# Altium footprint library Selex_PCBLib.PcbLib: 388 footprints (part 15 of 25)
Each footprint in its own frame and in the unit in brackets; x right, y up, seen from the top. Pads: shape width x height; smd on the part's side, far side on the other; paste and mask are expansions set on the pad; w line width, h text height; cw(c..) or ccw(c..) is an arc to the next point about the centre after c.
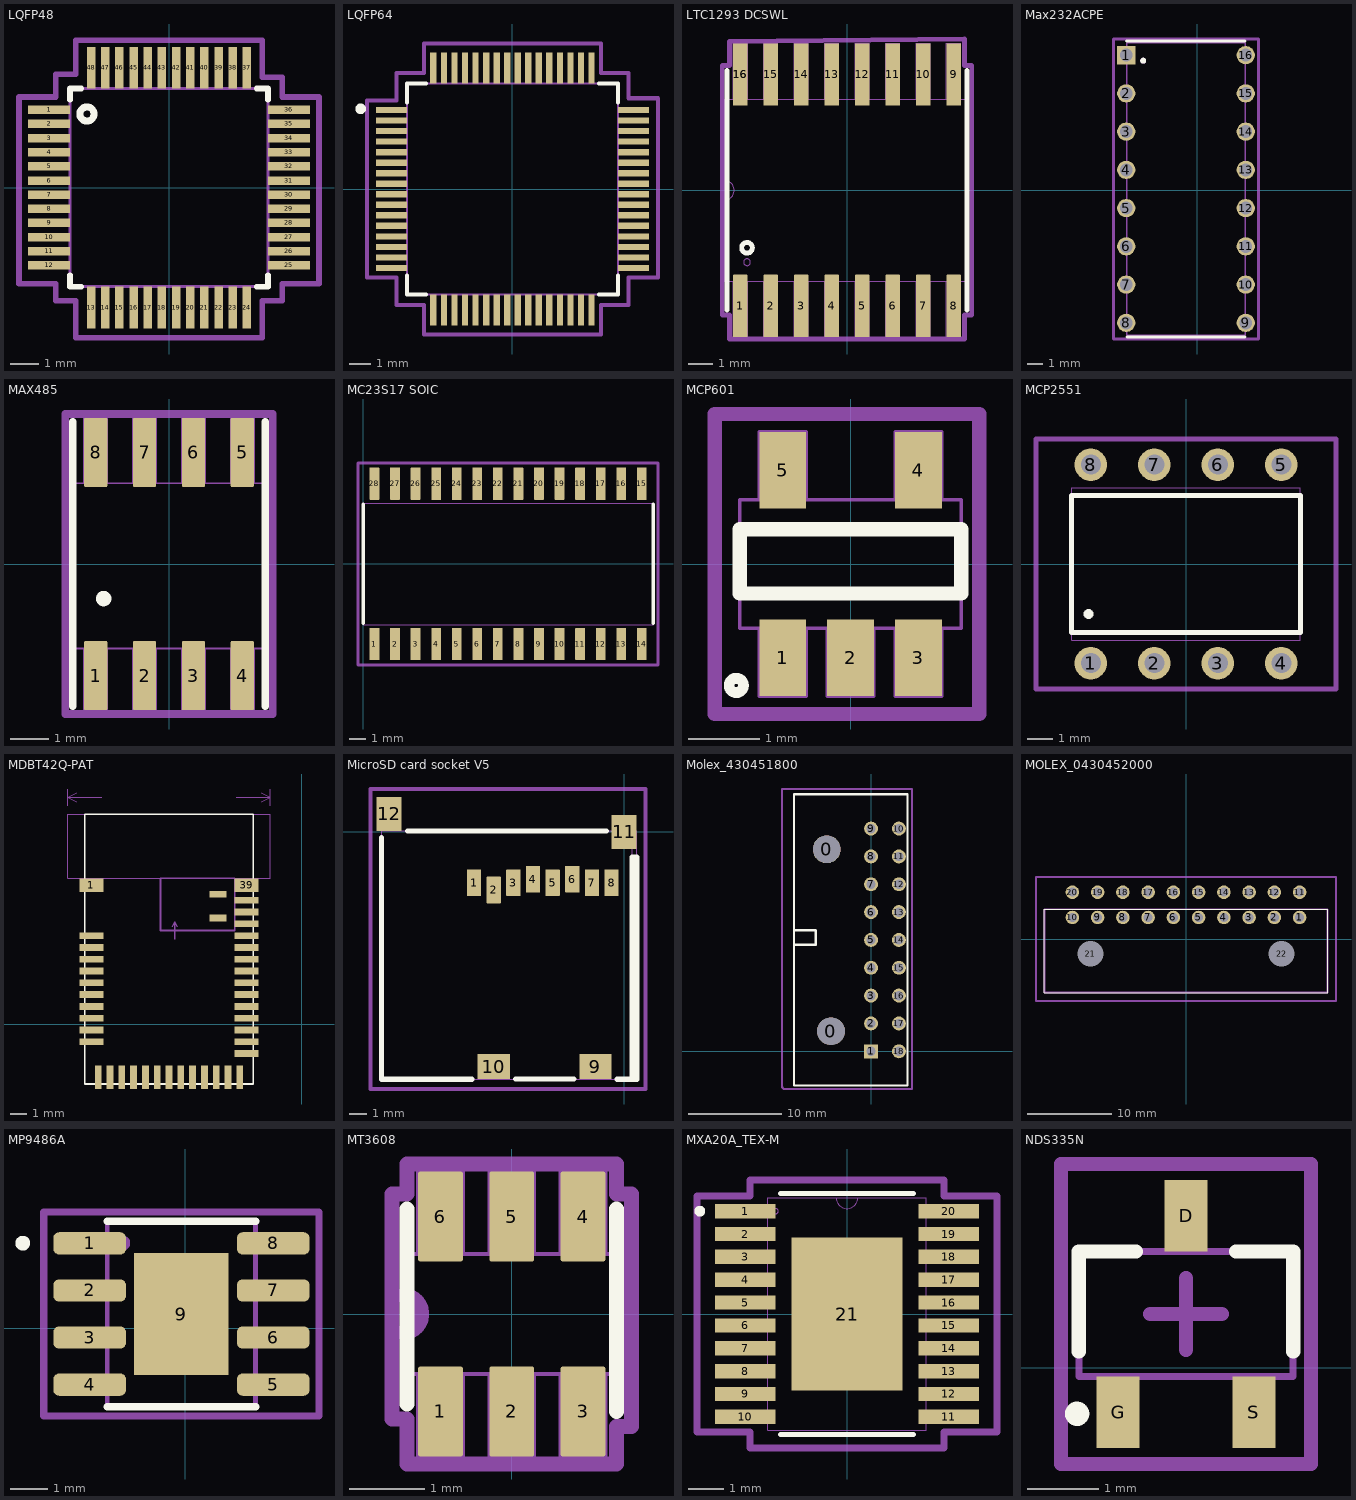
[diagram p14: the footprints below, top view; thin cyan lines are the x and y axes]

## LQFP48 [mm] "LQFP48_0P5x8P5"
pads (48):
  rect 1.475x0.3 smd: 1(-4.238,2.75) 2(-4.238,2.25) 3(-4.238,1.75) 4(-4.238,1.25) 5(-4.238,0.75) 6(-4.238,0.25) 7(-4.238,-0.25) 8(-4.238,-0.75) 9(-4.238,-1.25) 10(-4.238,-1.75) 11(-4.238,-2.25) 12(-4.238,-2.75) 25(4.238,-2.75) 26(4.238,-2.25) 27(4.238,-1.75) 28(4.238,-1.25) 29(4.238,-0.75) 30(4.238,-0.25) 31(4.238,0.25) 32(4.238,0.75) 33(4.238,1.25) 34(4.238,1.75) 35(4.238,2.25) 36(4.238,2.75)
  rect 0.3x1.475 smd: 13(-2.75,-4.238) 14(-2.25,-4.238) 15(-1.75,-4.238) 16(-1.25,-4.238) 17(-0.75,-4.238) 18(-0.25,-4.238) 19(0.25,-4.238) 20(0.75,-4.238) 21(1.25,-4.238) 22(1.75,-4.238) 23(2.25,-4.238) 24(2.75,-4.238) 37(2.75,4.238) 38(2.25,4.238) 39(1.75,4.238) 40(1.25,4.238) 41(0.75,4.238) 42(0.25,4.238) 43(-0.25,4.238) 44(-0.75,4.238) 45(-1.25,4.238) 46(-1.75,4.238) 47(-2.25,4.238) 48(-2.75,4.238)
Top Overlay:
  circle w0.25: c-2.9,2.6 r0.25
  lines w0.2: -3.5,-3.1 -3.5,-3.5 -3.1,-3.5 ; -3.5,3.1 -3.5,3.5 -3.1,3.5 ; 3.1,-3.5 3.5,-3.5 3.5,-3.1 ; 3.1,3.5 3.5,3.5 3.5,3.1
Mechanical 13:
  lines w0.1: -3.5,-3.5 3.5,-3.5 3.5,3.5 -3.5,3.5 -3.5,-3.5
Mechanical 15:
  lines w0.2: -5.3,-3.4 -4,-3.4 -4,-4 -3.3,-4 -3.3,-5.3 3.3,-5.3 3.3,-4 4,-4 4,-3.4 5.3,-3.4 5.3,3.2 4,3.2 4,3.9 3.3,3.9 3.3,5.2 -3.3,5.2 -3.3,4 -4,4 -4,3.2 -5.3,3.2 -5.3,-3.4
3D body "STM32G431C6T6.stp": height 0, standoff 0, extent 0,0 0,0

## LQFP64 [mm] "LQFP64_0P5x11P5"
pads (64):
  rect 1.475x0.3 smd: 1(-5.738,3.75) 2(-5.738,3.25) 3(-5.738,2.75) 4(-5.738,2.25) 5(-5.738,1.75) 6(-5.738,1.25) 7(-5.738,0.75) 8(-5.738,0.25) 9(-5.738,-0.25) 10(-5.738,-0.75) 11(-5.738,-1.25) 12(-5.738,-1.75) 13(-5.738,-2.25) 14(-5.738,-2.75) 15(-5.738,-3.25) 16(-5.738,-3.75) 33(5.738,-3.75) 34(5.738,-3.25) 35(5.738,-2.75) 36(5.738,-2.25) 37(5.738,-1.75) 38(5.738,-1.25) 39(5.738,-0.75) 40(5.738,-0.25) 41(5.738,0.25) 42(5.738,0.75) 43(5.738,1.25) 44(5.738,1.75) 45(5.738,2.25) 46(5.738,2.75) 47(5.738,3.25) 48(5.738,3.75)
  rect 0.3x1.475 smd: 17(-3.75,-5.738) 18(-3.25,-5.738) 19(-2.75,-5.738) 20(-2.25,-5.738) 21(-1.75,-5.738) 22(-1.25,-5.738) 23(-0.75,-5.738) 24(-0.25,-5.738) 25(0.25,-5.738) 26(0.75,-5.738) 27(1.25,-5.738) 28(1.75,-5.738) 29(2.25,-5.738) 30(2.75,-5.738) 31(3.25,-5.738) 32(3.75,-5.738) 49(3.75,5.738) 50(3.25,5.738) 51(2.75,5.738) 52(2.25,5.738) 53(1.75,5.738) 54(1.25,5.738) 55(0.75,5.738) 56(0.25,5.738) 57(-0.25,5.738) 58(-0.75,5.738) 59(-1.25,5.738) 60(-1.75,5.738) 61(-2.25,5.738) 62(-2.75,5.738) 63(-3.25,5.738) 64(-3.75,5.738)
Top Overlay:
  circle w0.25: c-7.2,3.8 r0.125
  lines w0.2: -5,-4.1 -5,-5 -4.1,-5 ; -5,4.1 -5,5 -4.1,5 ; 4.1,-5 5,-5 5,-4.1 ; 4.1,5 5,5 5,4.1
Mechanical 13:
  lines w0.1: -5,-5 -5,5 5,5 5,-5 -5,-5
Mechanical 15:
  lines w0.2: -6.9,-4.2 -6.9,4.2 -5.5,4.2 -5.5,5.5 -4.2,5.5 -4.2,6.9 4.2,6.9 4.2,5.5 5.5,5.5 5.5,4.3 6.9,4.3 6.9,-4.2 5.5,-4.2 5.5,-5.5 4.2,-5.5 4.2,-6.9 -4.2,-6.9 -4.2,-5.5 -5.5,-5.5 -5.5,-4.2 -6.9,-4.2
3D body "STM32F103RBT6.stp": height 1.6, standoff 0, extent -6,-6 6,6

## LTC1293 DCSWL [mm] "SMD, 16-Lead plastic SOL"
height 2.7
pads (17):
  rrect10% 0.6x2.6 smd mask+0.05: 1(-4.445,-4.821) 2(-3.175,-4.821) 3(-1.905,-4.821) 4(-0.635,-4.821) 5(0.635,-4.821) 6(1.905,-4.821) 7(3.175,-4.821) 8(4.445,-4.821) 9(4.445,4.822) 10(3.175,4.822) 11(1.905,4.822) 12(0.635,4.822) 13(-0.635,4.822) 14(-1.905,4.822) 15(-3.175,4.822) 16(-4.445,4.822) 16(-4.445,4.822)
Top Overlay:
  circle w0.2: c-4.165,-2.4 r0.224
  lines w0.2: -5,-5 -5,5 ; 5,-5 5,5
Mechanical 1:
  circle w0.05: c-4.165,-3 r0.141
  lines w0.05: -5.1,-0.405 ccw(c-5.1,-0.003) -5.1,0.4 ; -4.745,-3.798 -4.745,-6.121 -4.145,-6.121 -4.145,-3.798 -4.334,-3.798 -5.1,-3.798 -5.1,3.798 -4.556,3.798 -4.145,3.798 -4.145,6.122 -4.745,6.122 -4.745,3.798 ; -4.61,-3.798 5,-3.798 ; -4.61,3.798 5,3.798 ; 5.045,-3.798 5.045,-1.899 5.045,1.899 5.045,3.798 ; -3.475,-6.121 -3.475,-3.798 -3.064,-3.798 -2.875,-3.798 -2.875,-6.121 -3.475,-6.121 ; -3.475,3.798 -3.475,6.122 -2.875,6.122 -2.875,3.798 -3.286,3.798 -3.475,3.798 ; -2.205,-6.121 -1.605,-6.121 -1.605,-3.798 -1.794,-3.798 -2.205,-3.798 -2.205,-6.121 ; -2.205,3.798 -2.205,6.122 -1.605,6.122 -1.605,3.798 -2.016,3.798 -2.205,3.798 ; -0.935,-6.121 -0.335,-6.121 -0.335,-3.798 -0.524,-3.798 -0.935,-3.798 -0.935,-6.121 ; -0.935,3.798 -0.935,6.122 -0.335,6.122 -0.335,3.798 -0.746,3.798 -0.935,3.798 ; 0.335,-6.121 0.935,-6.121 0.935,-3.798 0.746,-3.798 0.335,-3.798 0.335,-6.121 ; 0.335,3.798 0.335,6.122 0.935,6.122 0.935,3.798 0.524,3.798 0.335,3.798 ; 1.605,-6.121 2.205,-6.121 2.205,-3.798 2.016,-3.798 1.605,-3.798 1.605,-6.121 ; 1.605,3.798 1.605,6.122 2.205,6.122 2.205,3.798 1.794,3.798 1.605,3.798 ; 2.875,-6.121 3.475,-6.121 3.475,-3.798 3.286,-3.798 2.875,-3.798 2.875,-6.121 ; 2.875,3.798 2.875,6.122 3.475,6.122 3.475,3.798 3.064,3.798 2.875,3.798 ; 4.145,-6.121 4.745,-6.121 4.745,-3.798 4.556,-3.798 4.145,-3.798 4.145,-6.121 ; 4.145,3.798 4.145,6.122 4.745,6.122 4.745,3.798 4.334,3.798 4.145,3.798
Mechanical 15:
  lines w0.2: -5.2,-0.1 -5.2,5.2 -4.9,5.2 -4.9,6.2 4.9,6.3 4.9,5.2 5.2,5.2 5.2,-5.2 4.9,-5.2 4.9,-6.2 -4.9,-6.2 -4.9,-5.2 -5.2,-5.2 -5.2,0.4
3D body "CircuitWorks-SOL-16.step": height 1.75, standoff 0, extent -5.165,-4.55 4.835,4.75

## Max232ACPE [mm]
pads (16):
  rect 1.21x1.21 hole 0.86: 1(-4.728,8.969)
  round 1.21 hole 0.86: 2(-4.728,6.429) 3(-4.728,3.889) 4(-4.728,1.349) 5(-4.728,-1.191) 6(-4.728,-3.731) 7(-4.728,-6.271) 8(-4.728,-8.811) 9(3.212,-8.811) 10(3.212,-6.271) 11(3.212,-3.731) 12(3.212,-1.191) 13(3.212,1.349) 14(3.212,3.889) 15(3.212,6.429) 16(3.212,8.969)
Top Overlay:
  circle w0.2: c-3.6,8.6 r0.1
  lines w0.2: -4.7,9.9 3.17,9.9 ; -4.693,-9.738 3.177,-9.738
Mechanical 13:
  circle w0.2: c-3.6,8.6 r0.1
  lines w0.127: -4.693,-9.636 3.177,-9.636 3.177,9.794 -4.693,9.794 -4.693,-9.636
Mechanical 15:
  lines w0.2: -5.583,-9.886 4.067,-9.886 4.067,10.044 -5.583,10.044 -5.583,-9.886

## MAX485 [mm] "SMD, SOP8, 8PIN, 0.65"
height 1.1
pads (8):
  rrect10% 0.6x1.8 smd mask+0.05: 1(-1.905,-2.9) 2(-0.635,-2.9) 3(0.635,-2.9) 4(1.905,-2.9) 5(1.905,2.9) 6(0.635,2.9) 7(-0.635,2.9) 8(-1.905,2.9)
Top Overlay:
  circle w0.2: c-1.7,-0.9 r0.1
  lines w0.2: -2.5,-3.7 -2.5,3.7 ; 2.5,-3.7 2.5,3.7
Mechanical 1:
  lines w0.05: -2.5,-0.7 -2.5,-2.2 2.5,-2.2 2.5,2.1 -2.5,2.1 -2.5,0.3 ; -2.205,-3.8 -1.605,-3.8 -1.605,-2.2 -2.205,-2.2 -2.205,-3.8 ; -2.205,2.1 -1.605,2.1 -1.605,3.8 -2.205,3.8 -2.205,2.1 ; -0.935,-3.8 -0.935,-2.2 -0.335,-2.2 -0.335,-3.8 -0.935,-3.8 ; -0.935,2.1 -0.935,3.8 -0.335,3.8 -0.335,2.1 -0.935,2.1 ; 0.335,-3.8 0.335,-2.2 0.935,-2.2 0.935,-3.8 0.335,-3.8 ; 0.335,2.1 0.935,2.1 0.935,3.8 0.335,3.8 0.335,2.1 ; 1.605,-3.8 1.605,-2.2 2.205,-2.2 2.205,-3.8 1.605,-3.8 ; 1.605,2.1 1.605,3.8 2.205,3.8 2.205,2.1 1.605,2.1
  text "1" at -2,-2 h0.6
  text "4" at 1.7,-2 h0.6
  text "5" at 1.7,1 h0.6
  text "8" at -2.1,1 h0.6
Mechanical 7:
  lines w0.2: -2.7,-3.9 -2.7,1.3 -2.7,3.9 2.7,3.9 2.7,-3.9 -2.7,-3.9
3D body "User Library-HSOP8-1.STEP": height 1.74, standoff -0.01, extent -2.5,-3.2 2.5,3

## MC23S17 SOIC [mm] "MC23S17 SOIC 28 PIN"
height 2.65
pads (28):
  rrect10% 0.6x2 smd mask+0.05: 1(0.695,-4.95) 2(1.965,-4.95) 3(3.235,-4.95) 4(4.505,-4.95) 5(5.775,-4.95) 6(7.045,-4.95) 7(8.315,-4.95) 8(9.585,-4.95) 9(10.855,-4.95) 10(12.125,-4.95) 11(13.395,-4.95) 12(14.665,-4.95) 13(15.935,-4.95) 14(17.205,-4.95) 15(17.205,4.95) 16(15.935,4.95) 17(14.665,4.95) 18(13.395,4.95) 19(12.125,4.95) 20(10.855,4.95) 21(9.585,4.95) 22(8.315,4.95) 23(7.045,4.95) 24(5.775,4.95) 25(4.505,4.95) 26(3.235,4.95) 27(1.965,4.95) 28(0.695,4.95)
Top Overlay:
  lines w0.2: 0,-3.68 0,3.68 ; 17.91,-3.68 17.91,3.68
Mechanical 1:
  lines w0.05: 0,-3.75 0,3.75 17.9,3.75 17.9,-3.75 0,-3.75
  text "28" at 0.4,2.5 h0.8
  text "15" at 16.4,2.5 h0.8
  text "14" at 16.5,-3.5 h0.8
  text "1" at 0.5,-3.4 h0.8
Mechanical 15:
  lines w0.2: -0.32,-6.25 18.2,-6.25 18.2,6.23 -0.32,6.23 -0.32,-6.24
3D body "User Library-28-SOIC.step": height 2.83, standoff 0.07, extent -0.05,-5.1 17.85,5.2

## MCP601 [mm] "Opam"
height 1.45
pads (5):
  rect 0.655x1.075 smd mask+0.1: 1(-0.95,-1.312) 2(0,-1.312) 3(0.95,-1.312) 4(0.95,1.313) 5(-0.95,1.313)
Top Overlay:
  circle w0.15: c-1.6,-1.7 r0.1
  lines w0.2: -1.55,-0.412 -1.55,0.487 1.55,0.487 1.55,-0.412 -1.55,-0.412
Mechanical 1:
  lines w0.05: -1.278,-0.9 -1.278,-1.85 -0.623,-1.85 -0.623,-0.9 ; -1.278,0.9 -1.278,1.85 -0.623,1.85 -0.623,0.9 ; -0.327,-0.9 -0.327,-1.85 0.327,-1.85 0.327,-0.9 ; 0.623,-0.9 0.623,-1.85 1.278,-1.85 1.278,-0.9 ; 0.623,0.9 0.623,1.85 1.278,1.85 1.278,0.9 ; -1.55,-0.9 -1.55,0.9 1.55,0.9 1.55,-0.9 -1.55,-0.9
  text "OPAMP" at -1.1,-0.2 h0.5
  text "4" at 0.8,1.1 h0.5
  text "5" at -1.1,1.1 h0.5
  text "3" at 0.8,-1.6 h0.5
  text "2" at -0.1,-1.6 h0.5
  text "1" at -1,-1.6 h0.5
Mechanical 3:
  lines w0.2: -1.9,-2.1 1.8,-2.1 1.8,2.1 -1.9,2.1 -1.9,-2.1
3D body "SOT23.step": height 1.05, standoff -0.05, extent -1.5,-1.25 1.5,1.25

## MCP2551 [mm] "DIP8"
height 3.56
pads (8):
  round 1.3 hole 0.8 mask+0.1: 1(-3.81,-3.97) 2(-1.27,-3.97) 3(1.27,-3.97) 4(3.81,-3.97) 5(3.81,3.97) 6(1.27,3.97) 7(-1.27,3.97) 8(-3.81,3.97)
Top Overlay:
  circle w0.2: c-3.9,-2 r0.1
  lines w0.2: -4.57,0.686 -4.57,2.745 4.57,2.745 4.57,-2.745 -4.57,-2.745 -4.57,0.7
Mechanical 1:
  lines w0.05: -4.57,-0.686 -4.57,-3.05 4.57,-3.05 4.57,3.05 -4.57,3.05 -4.57,0.686
  text "1" at -3.9,-2.8 h0.8
  text "4" at 3.5,-2.8 h0.8
  text "5" at 3.6,1.9 h0.8
  text "8" at -4,2 h0.8
Mechanical 3:
  lines w0.2: -6,-5 -6,5 6,5 6,-5 -6,-5
3D body "CircuitWorks-DIP 8 IC (1).step": height 5.08, standoff -3.5, extent -5.46,-3.935 5.46,3.935

## MDBT42Q-PAT [mm]
pads (41):
  rect 1.4x0.8 smd mask+0: 1(-12.474,8.247) 39(-3.274,8.247)
  rect 1.4x0.4 smd mask+0: 2(-12.474,5.247) 3(-12.474,4.547) 4(-12.474,3.847) 5(-12.474,3.147) 6(-12.474,2.447) 7(-12.474,1.747) 8(-12.474,1.047) 9(-12.474,0.347) 10(-12.474,-0.353) 11(-12.474,-1.053) 25(-3.274,-1.753) 26(-3.274,-1.053) 27(-3.274,-0.353) 28(-3.274,0.347) 29(-3.274,1.047) 30(-3.274,1.747) 31(-3.274,2.447) 32(-3.274,3.147) 33(-3.274,3.847) 34(-3.274,4.547) 35(-3.274,5.247) 36(-3.274,5.947) 37(-3.274,6.647) 38(-3.274,7.347)
  rect 0.4x1.4 smd mask+0: 12(-12.074,-3.153) 13(-11.374,-3.153) 14(-10.674,-3.153) 15(-9.974,-3.153) 16(-9.274,-3.153) 17(-8.574,-3.153) 18(-7.874,-3.153) 19(-7.174,-3.153) 20(-6.474,-3.153) 21(-5.774,-3.153) 22(-5.074,-3.153) 23(-4.374,-3.153) 24(-3.674,-3.153)
  rect 1x0.4 smd mask+0: 40(-4.974,7.697) 41(-4.974,6.297)
Top Overlay:
  lines w0.1: -12.874,-3.553 -12.874,12.447 -7.874,12.447 -2.874,12.447 -2.874,-3.553 -12.874,-3.553
Top Courtyard:
  lines w0.05: -13.874,12.947 -13.874,13.947 ; -13.335,13.177 -13.874,13.447 ; -13.335,13.717 -13.874,13.447 ; -11.874,13.447 -13.874,13.447 ; -3.874,13.447 -1.874,13.447 ; -2.413,13.177 -1.874,13.447 ; -2.413,13.717 -1.874,13.447 ; -1.874,12.947 -1.874,13.947 ; -13.874,8.647 -1.874,8.647 -1.874,12.447 -13.874,12.447 -13.874,8.647
  text "No ground pad" at -10.489,10.557 h0.45
  text "as wide as possible" at -11.557,13.247 h0.55
Mechanical 3:
  lines w0.08: -7.674,5.772 -7.524,6.072 ; -7.524,5.047 -7.524,6.072 ; -7.374,5.772 -7.524,6.072
  lines w0.1: -8.374,5.547 -3.974,5.547 -3.974,8.647 -8.374,8.647 -8.374,5.547
  text "Toplayer no ground pad" at -10.674,4.672 h0.3
3D body "mdbt42q-p.stp": height 2.2, standoff 0, extent -12.941,-3.535 -2.941,12.465

## MicroSD card socket V5 [mm]
height 2.1
pads (12):
  rrect10% 0.8x1.5 smd mask+0.1: 1(-8.4,-2.85) 2(-7.3,-3.25) 3(-6.2,-2.85) 4(-5.1,-2.65) 5(-4,-2.85) 6(-2.9,-2.65) 7(-1.8,-2.85) 8(-0.7,-2.85)
  rect 1.8x1.4 smd mask+0.1: 9(-1.6,-13.15) 10(-7.3,-13.15)
  rect 1.4x1.9 smd mask+0.1: 11(0,0) 12(-13.15,1)
Top Overlay:
  lines w0.3: -13.58,-0.32 -13.58,-13.85 -8.53,-13.85 ; -12.12,0.05 -0.98,0.05 ; -6.06,-13.84 -2.81,-13.84 ; -0.38,-13.85 0.7,-13.85 0.7,-1.43 0.45,-1.43 0.45,-13.85
Mechanical 1:
  lines w0.05: -0.78,0.05 0.7,0.05 0.7,-13.85 -2.51,-13.85 -6.41,-13.85 -13.58,-13.85 ; -0.7,0.05 -12.45,0.05 -13.58,0.05 ; 0.45,-13.85 0.45,0.05 ; -13.58,-13.85 -13.58,0.05 ; -13.58,-13.85 -13.58,0.05
Mechanical 15:
  lines w0.2: -14.2,-14.4 1.2,-14.4 1.2,2.1 1.2,2.4 -14.2,2.4 -14.2,-14.4
3D body "microsdcard.STEP": height 1.83, standoff -0.07, extent -13.43,-13.5 0.57,1.7

## Molex_430451800 [mm]
height 4.2
pads (20):
  round 3 hole 3: 0(-4.775,21.768) 0(-4.32,2.16)
  rect 1.5x1.5 hole 1: 1(0,0)
  round 1.5 hole 1: 2(0,3) 3(0,6) 4(0,9) 5(0,12) 6(0,15) 7(0,18) 8(0,21) 9(0,24) 10(3,24) 11(3,21) 12(3,18) 13(3,15) 14(3,12) 15(3,9) 16(3,6) 17(3,3) 18(3,0)
Top Overlay:
  lines w0.254: -8.179,11.481 -5.944,11.481 -5.944,13.005 -5.994,13.056 -8.179,13.056 ; -8.309,-3.683 3.931,-3.683 3.931,27.711 -8.309,27.711 -8.309,-3.683
Mechanical 7:
  lines w0.2: -9.601,-3.861 -9.601,28.27 4.42,28.27 4.42,-4.064 -9.398,-4.064
  lines w0.254: -9.601,-3.861 -9.398,-4.064
3D body "430451800.stp": height 9.33, standoff -2.62, extent -8.993,-3.51 3.247,27.64

## MOLEX_0430452000 [mm]
pads (22):
  round 1.605 hole 1.07: 1(13.5,2.559) 2(10.5,2.559) 3(7.5,2.559) 4(4.5,2.559) 5(1.5,2.559) 6(-1.5,2.559) 7(-4.5,2.559) 8(-7.5,2.559) 9(-10.5,2.559) 10(-13.5,2.559) 11(13.5,5.559) 12(10.5,5.559) 13(7.5,5.559) 14(4.5,5.559) 15(1.5,5.559) 16(-1.5,5.559) 17(-4.5,5.559) 18(-7.5,5.559) 19(-10.5,5.559) 20(-13.5,5.559)
  round 1.525 hole 3.05 unplated: 21(-11.35,-1.761) 22(11.35,-1.761)
Top Overlay:
  lines w0.1: -16.825,-6.361 16.825,-6.361 16.825,3.549 -16.825,3.549 -16.825,-6.361
Mechanical 13:
  lines w0.2: -16.825,-6.361 16.825,-6.361 16.825,3.549 -16.825,3.549 -16.825,-6.361
Mechanical 15:
  lines w0.2: -17.825,-7.361 17.825,-7.361 17.825,7.361 -17.825,7.361 -17.825,-7.361
3D body "0430452000.stp": height 8.79, standoff -3.16, extent -17.075,-6.36 17.075,5.88

## MP9486A [mm]
pads (9):
  rrect52% 1.96x0.6 smd: 1(-2.579,2.284) 2(-2.579,1.014) 3(-2.579,-0.256) 4(-2.579,-1.526) 5(2.371,-1.526) 6(2.371,-0.256) 7(2.371,1.014) 8(2.371,2.284)
  rect 2.55x3.3 smd paste-3: 9(-0.104,0.379)
Top Overlay:
  circle w0.2: c-4.384,2.289 r0.1
  lines w0.2: -2.104,-2.121 1.896,-2.121 ; -2.104,2.879 1.896,2.879
Top Paste:
  region: 0.702,-0.664 -0.91,-0.664 -0.91,1.422 0.702,1.422
Mechanical 13:
  circle w0.2: c-1.684,2.289 r0.1
  lines w0.127: -2.104,-2.121 1.896,-2.121 1.896,2.879 -2.104,2.879 -2.104,-2.121
Mechanical 15:
  lines w0.2: -3.814,-2.371 -2.354,-2.371 2.146,-2.371 3.606,-2.371 3.606,3.129 2.146,3.129 -2.354,3.129 -3.814,3.129 -3.814,-2.371
3D body "step_temp.STEP": height 1.7, standoff 0, extent -3.025,-2.072 2.969,2.83

## MT3608 [mm] "OUTPUT BOOT 5V TO 28V, SMD, SOT23-6"
height 1.45
pads (6):
  rrect10% 0.6x1.2 smd mask+0.05: 1(-0.95,-1.3) 2(0,-1.3) 3(0.95,-1.3) 4(0.95,1.3) 5(0,1.3) 6(-0.95,1.3)
Top Overlay:
  lines w0.2: -1.4,-1.2 -1.4,1.4 ; 1.4,-1.3 1.4,1.4
Mechanical 1:
  lines w0.05: -1.45,-0.25 -1.45,-0.8 1.45,-0.8 1.45,0.8 -1.45,0.8 -1.45,0.25 ; -1.25,-1.9 -1.25,-0.8 -0.65,-0.8 -0.65,-1.9 -1.25,-1.9 ; -1.25,0.8 -0.65,0.8 -0.65,1.9 -1.25,1.9 -1.25,0.8 ; -0.3,-1.9 0.3,-1.9 0.3,-0.8 -0.3,-0.8 -0.3,-1.9 ; -0.3,0.8 0.3,0.8 0.3,1.9 -0.3,1.9 -0.3,0.8 ; 0.65,-1.9 1.25,-1.9 1.25,-0.8 0.65,-0.8 0.65,-1.9 ; 0.65,0.8 1.25,0.8 1.25,1.9 0.65,1.9 0.65,0.8
  lines w0.2: -1.45,-0.25 ccw(c-1.45,0) -1.45,0.25
Mechanical 15:
  lines w0.2: -1.6,-1.4 -1.4,-1.4 -1.4,-2 1.4,-2 1.4,-1.5 1.6,-1.5 1.6,1.6 1.4,1.6 1.4,2 -1.4,2 -1.4,1.6 -1.6,1.6 -1.6,-1.4
3D body "User Library-SOT23-6-2.step": height 1.45, standoff 0, extent -1.45,-1.4 1.45,1.4

## MXA20A_TEX-M [mil]
pads (21):
  rect 68x16 smd: 1(-114,115.16) 2(-114,89.57) 3(-114,63.98) 4(-114,38.39) 5(-114,12.8) 6(-114,-12.8) 7(-114,-38.39) 8(-114,-63.98) 9(-114,-89.57) 10(-114,-115.16) 11(114,-115.16) 12(114,-89.57) 13(114,-63.98) 14(114,-38.39) 15(114,-12.8) 16(114,12.8) 17(114,38.39) 18(114,63.98) 19(114,89.57) 20(114,115.16)
  rect 124x171 smd: 21(0,0)
Top Overlay:
  circle w6: c-164.8,115.16 r3
  lines w6: -74.4,-135 74.4,-135 ; -74.4,135 74.4,135
Mechanical 13:
  circle w0: c-80,115.16 r3
  lines w0: -12,130 ccw(c0,130) 12,130
  lines w1: -126,-121.16 -126,-109.16 -88.5,-109.16 -88.5,-121.16 -126,-121.16 ; -126,-95.57 -126,-83.57 -88.5,-83.57 -88.5,-95.57 -126,-95.57 ; -126,-69.98 -126,-57.98 -88.5,-57.98 -88.5,-69.98 -126,-69.98 ; -126,-44.39 -126,-32.39 -88.5,-32.39 -88.5,-44.39 -126,-44.39 ; -126,-18.8 -126,-6.8 -88.5,-6.8 -88.5,-18.8 -126,-18.8 ; -126,6.8 -126,18.8 -88.5,18.8 -88.5,6.8 -126,6.8 ; -126,32.39 -126,44.39 -88.5,44.39 -88.5,32.39 -126,32.39 ; -126,57.98 -126,69.98 -88.5,69.98 -88.5,57.98 -126,57.98 ; -126,83.57 -126,95.57 -88.5,95.57 -88.5,83.57 -126,83.57 ; -126,109.16 -126,121.16 -88.5,121.16 -88.5,109.16 -126,109.16 ; -88.5,-130 88.5,-130 88.5,130 -88.5,130 -88.5,-130 ; 88.5,-121.16 88.5,-109.16 126,-109.16 126,-121.16 88.5,-121.16 ; 88.5,-95.57 88.5,-83.57 126,-83.57 126,-95.57 88.5,-95.57 ; 88.5,-69.98 88.5,-57.98 126,-57.98 126,-69.98 88.5,-69.98 ; 88.5,-44.39 88.5,-32.39 126,-32.39 126,-44.39 88.5,-44.39 ; 88.5,-18.8 88.5,-6.8 126,-6.8 126,-18.8 88.5,-18.8 ; 88.5,6.8 88.5,18.8 126,18.8 126,6.8 88.5,6.8 ; 88.5,32.39 88.5,44.39 126,44.39 126,32.39 88.5,32.39 ; 88.5,57.98 88.5,69.98 126,69.98 126,57.98 88.5,57.98 ; 88.5,83.57 88.5,95.57 126,95.57 126,83.57 88.5,83.57 ; 88.5,109.16 88.5,121.16 126,121.16 126,109.16 88.5,109.16
Mechanical 15:
  lines w7.87: -168,-131.95 -168,131.95 -108.5,131.95 -108.5,150 108.5,150 108.5,131.95 168,131.95 168,-131.95 108.5,-131.95 108.5,-150 -108.5,-150 -108.5,-131.95 -168,-131.95
3D body: height 10, standoff 0, extent 0,0 10,10

## NDS335N [mm]
pads (3):
  rect 0.6x1 smd: D(3.35,2.125) G(2.4,-0.625) S(4.3,-0.625)
Top Overlay:
  circle w0.2: c1.826,-0.647 r0.07
  lines w0.2: 1.85,0.225 1.85,1.625 2.65,1.625 ; 4.05,1.625 4.85,1.625 4.85,0.225
Mechanical 13:
  lines w0.1: 1.85,-0.125 4.85,-0.125 4.85,1.625 1.85,1.625 1.85,-0.125
Mechanical 15:
  lines w0.2: 2.85,0.75 3.85,0.75 ; 3.35,0.25 3.35,1.25 ; 1.6,-1.35 5.1,-1.35 5.1,2.85 1.6,2.85 1.6,-1.35
3D body "SW3DPS-SOT-23-DEFAULT.STEP": height 1.06, standoff -0.04, extent 1.85,-0.5 4.85,2